# Altium footprint library Passive Pad Lib.PcbLib: 110 footprints (part 7 of 7)
Each footprint in its own frame and in the unit in brackets; x right, y up, seen from the top. Pads: shape width x height; smd on the part's side, far side on the other; paste and mask are expansions set on the pad; w line width, h text height; cw(c..) or ccw(c..) is an arc to the next point about the centre after c.
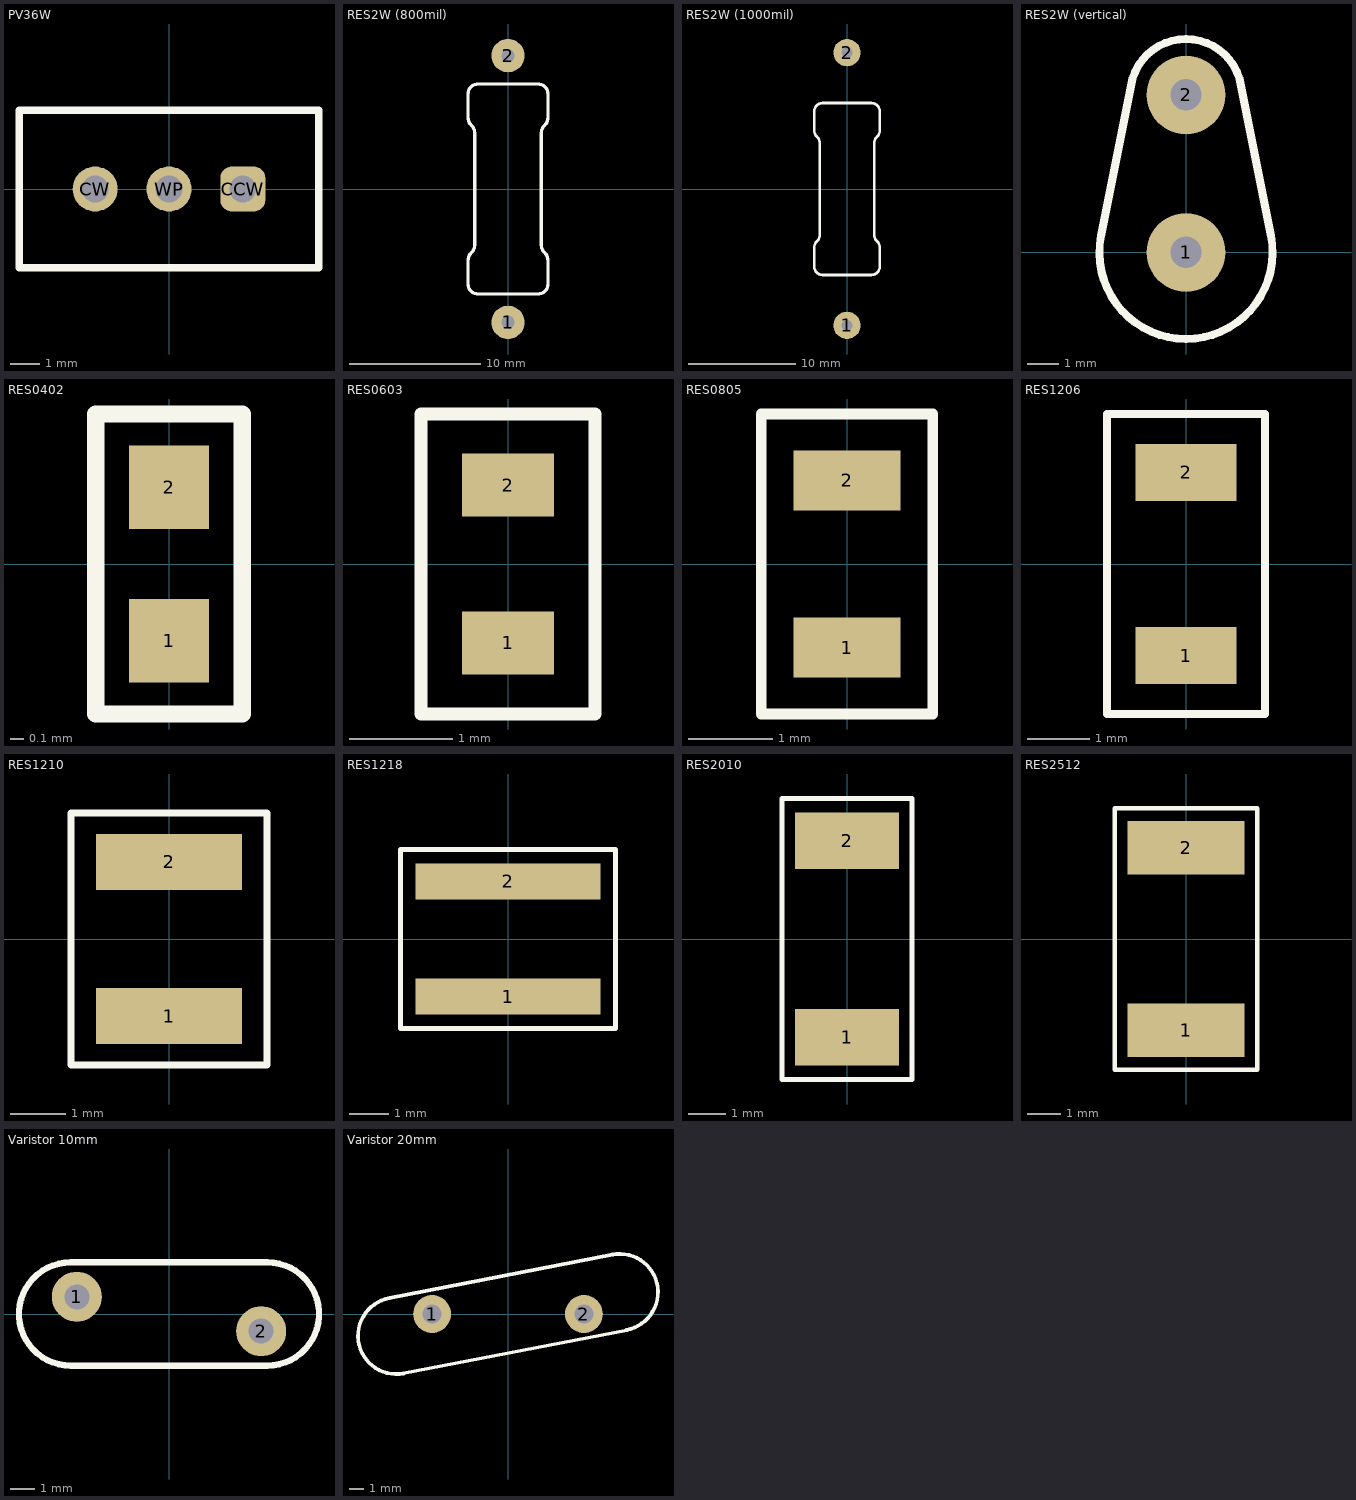
[diagram p6: the footprints below, top view; thin cyan lines are the x and y axes]

## PV36W [mil] "PV36W"
pads (3):
  rrect50% 60x60 hole 35.43: CCW(98.43,0)
  round 60 hole 35.43: CW(-98.43,0) WP(0,0)
Top Overlay:
  lines w10: -200,-105 -200,105 200,105 200,-105 -200,-105
3D body: height 10, standoff 0, extent -63,-110 -63,-110
3D body: height 10, standoff 0, extent -5,-34 -5,-34
3D body "PV36W.STEP": height 454.72, standoff -103.15, extent -187.59,-95.87 187.6,94.69

## RES2W (800mil) [mil] "Resistor 2W 800mil"
pads (2):
  round 100 hole 40: 1(0,-400) 2(0,400)
Top Overlay:
  lines w10: -120,-279.78 -120,-215 ; -110.33,-191.67 ccw(c-87,-215) -120,-215 ; -110.33,191.67 cw(c-87,215) -120,215 -120,285 cw(c-90,285) -90,315 90,315 cw(c90,285) 120,285 120,215 ; -109.19,-190.52 ccw(c-131.38,-168.33) -100,-168.33 -100,168.33 ccw(c-131.38,168.33) -109.19,190.52 ; 109.19,-190.52 cw(c131.38,-168.33) 100,-168.33 100,168.33 cw(c131.38,168.33) 109.19,190.52 ; 110.33,-191.67 cw(c87,-215) 120,-215 120,-285 cw(c90,-285) 90,-315 -90,-315 cw(c-90,-285) -120,-285 -120,-215 ; 110.33,191.67 ccw(c87,215) 120,215 ; 120,279.78 120,215
3D body "THD Resistor 2W 5% (800mil).STEP": height 233.27, standoff -71.85, extent -108.27,-415.74 108.27,415.75

## RES2W (1000mil) [mil] "Resistor 2W 1000mil"
pads (2):
  round 100 hole 40: 1(0,-500) 2(0,500)
Top Overlay:
  lines w10: -120,-279.78 -120,-215 ; -110.33,-191.67 ccw(c-87,-215) -120,-215 ; -110.33,191.67 cw(c-87,215) -120,215 -120,285 cw(c-90,285) -90,315 90,315 cw(c90,285) 120,285 120,215 ; -109.19,-190.52 ccw(c-131.38,-168.33) -100,-168.33 -100,168.33 ccw(c-131.38,168.33) -109.19,190.52 ; 109.19,-190.52 cw(c131.38,-168.33) 100,-168.33 100,168.33 cw(c131.38,168.33) 109.19,190.52 ; 110.33,-191.67 cw(c87,-215) 120,-215 120,-285 cw(c90,-285) 90,-315 -90,-315 cw(c-90,-285) -120,-285 -120,-215 ; 110.33,191.67 ccw(c87,215) 120,215 ; 120,279.78 120,215
3D body "THD Resistor 2W 5% (1000mil).STEP": height 233.27, standoff -71.85, extent -108.27,-515.74 108.27,515.75

## RES2W (vertical) [mil] "Resistor 2W vertical"
pads (2):
  round 100 hole 40: 1(0,0) 2(0,200)
Top Overlay:
  lines w10: -107.98,21 ccw(c0,0) 107.98,21 67.89,221 ccw(c0,200) -67.89,221 -108,21
3D body "THD Resistor 2W 5%_vertical.STEP": height 818.5, standoff -102.76, extent -108.27,-108.27 108.27,215.74

## RES0402 [mil] "0402 Reflow Pad"
pads (2):
  rect 23x24 smd: 1(0,-22) 2(0,22)
Top Overlay:
  lines w5: -21,-43 21,-43 21,43 -21,43 -21,-43
3D body "SMD Resistor 0402.STEP": height 13.86, standoff 0, extent -9.84,-19.69 9.84,19.68

## RES0603 [mil] "0603 Reflow Pad"
pads (2):
  rect 35x24 smd: 1(0,-30) 2(0,30)
Top Overlay:
  lines w5: -33,-57 33,-57 33,57 -33,57 -33,-57
3D body "SMD Resistor 0603.STEP": height 17.8, standoff 0, extent -15.75,-31.49 15.75,31.51

## RES0805 [mil] "0805 Reflow Pad"
pads (2):
  rect 50x28 smd: 1(0,-39) 2(0,39)
Top Overlay:
  lines w5: -40,-70 40,-70 40,70 -40,70 -40,-70
3D body "SMD Resistor 0805.STEP": height 19.76, standoff 0, extent -24.61,-39.37 24.6,39.37

## RES1206 [mil] "1206 Reflow Pad"
pads (2):
  rect 64x36 smd: 1(0,-58) 2(0,58)
Top Overlay:
  lines w5: -50,-95 -50,95 50,95 50,-95 -50,-95
3D body "SMD Resistor 1206.STEP": height 21.73, standoff 0, extent -31.5,-61.02 31.49,61.03

## RES1210 [mil] "1210 Reflow Pad"
pads (2):
  rect 104x40 smd: 1(0,-55) 2(0,55)
Top Overlay:
  lines w5: -70,-90 70,-90 70,90 -70,90 -70,-90
3D body "SMD Resistor 1210.STEP": height 21.73, standoff 0, extent -51.18,-61.02 51.18,61.03

## RES1218 [mil] "1218 Reflow Pad"
pads (2):
  rect 186x36 smd: 1(0,-58) 2(0,58)
Top Overlay:
  lines w5: -108,-90 108,-90 108,90 -108,90 -108,-90
3D body "SMD Resistor 1218.STEP": height 21.73, standoff 0, extent -90.55,-61.02 90.55,61.03

## RES2010 [mil] "2010 Reflow Pad"
pads (2):
  rect 110x60 smd: 1(0,-104) 2(0,104)
Top Overlay:
  lines w5: -69,-149 69,-149 69,149 -69,149 -69,-149
3D body "SMD Resistor 2010.STEP": height 21.73, standoff 0, extent -49.21,-98.42 49.21,98.43

## RES2512 [mil] "2512 Reflow Pad"
pads (2):
  rect 140x64 smd: 1(0,-109) 2(0,109)
Top Overlay:
  lines w5: -85,-156 -85,156 85,156 85,-156 -85,-156
3D body "SMD Resistor 2512.STEP": height 21.73, standoff 0, extent -61.03,-124.99 61.02,125.01

## Varistor 10mm [mil] "Leaded varistors Standar D series Size:D10X3,5mm"
pads (2):
  round 80 hole 40: 1(-147.64,27.56) 2(147.64,-27.56)
Top Overlay:
  lines w10: -157.48,-82.68 cw(c-157.48,0) -157.48,82.68 157.48,82.68 cw(c157.48,0) 157.48,-82.68 -157.48,-82.68
3D body "Varistor 10mm.STEP": height 586.22, standoff -102.76, extent -236.22,-76.77 236.22,76.77

## Varistor 20mm [mil] "Leaded varistors Standar D series Size:D20X5mm"
pads (2):
  round 100 hole 50: 1(-200,0) 2(200,0)
Top Overlay:
  lines w10: -275.6,-156.46 313.48,-42.54 ; -275.19,-156.61 cw(c-294.46,-57.47) -312,42 276.92,156.78 ; 275.19,156.61 cw(c294.46,57.47) 312,-42
3D body "Varistor 20mm.STEP": height 879.61, standoff -110.55, extent -410.89,-172.84 410.91,172.84